# Altium footprint library Miscellaneous Header.PcbLib: 168 footprints (part 7 of 11)
Each footprint in its own frame and in the unit in brackets; x right, y up, seen from the top. Pads: shape width x height; smd on the part's side, far side on the other; paste and mask are expansions set on the pad; w line width, h text height; cw(c..) or ccw(c..) is an arc to the next point about the centre after c.
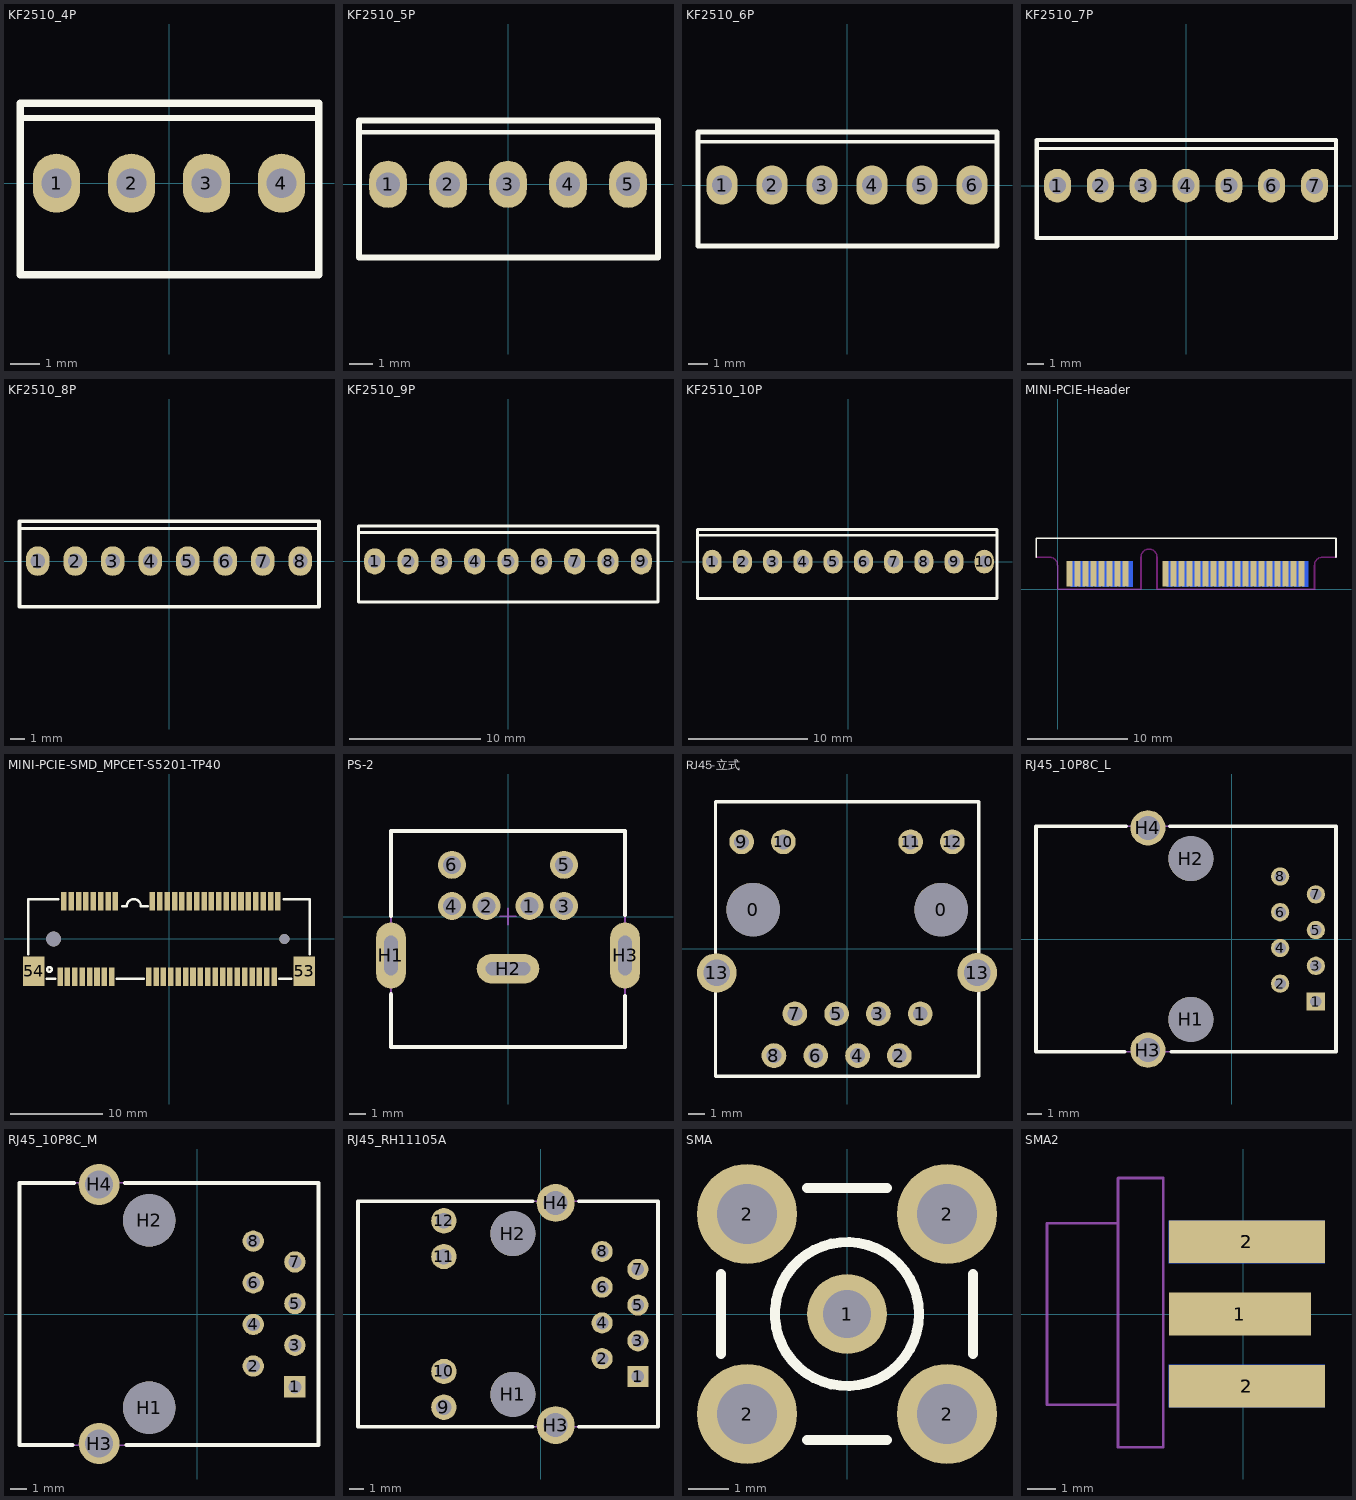
[diagram p6: the footprints below, top view; thin cyan lines are the x and y axes]

## KF2510_4P [mm]
pads (4):
  oval 1.6x2 hole 1: 1(-3.81,0) 2(-1.27,0) 3(1.27,0) 4(3.81,0)
Top Overlay:
  lines w0.2: -5.04,2.2 5.08,2.2
  lines w0.254: -5.04,-3.1 -5.04,2.7 5.08,2.7 5.08,-3.1 -5.04,-3.1
Mechanical 15:
  lines w0.1: -5.08,-3.1 -5.08,2.7 5.08,2.7 5.08,-3.1 -5.08,-3.1
3D body: height 11.73, standoff -2.55, extent -5.09,-3.2 5.07,2.7

## KF2510_5P [mm]
pads (5):
  oval 1.6x2 hole 1: 1(-5.08,0) 2(-2.54,0) 3(0,0) 4(2.54,0) 5(5.08,0)
Top Overlay:
  lines w0.2: -6.31,2.2 6.35,2.2
  lines w0.254: -6.31,-3.1 -6.31,2.7 6.35,2.7 6.35,-3.1 -6.31,-3.1
Mechanical 15:
  lines w0.1: -6.35,-3.1 -6.35,2.7 6.35,2.7 6.35,-3.1 -6.35,-3.1
3D body: height 11.73, standoff -3, extent -1.325,-3.175 6.475,2.725
3D body: height 11.73, standoff -2.55, extent -6.4,-3.175 -1.2,2.725

## KF2510_6P [mm]
pads (6):
  oval 1.6x2 hole 1: 1(-6.35,0) 2(-3.81,0) 3(-1.27,0) 4(1.27,0) 5(3.81,0) 6(6.35,0)
Top Overlay:
  lines w0.2: -7.58,2.2 7.62,2.2
  lines w0.254: -7.58,-3.1 -7.58,2.7 7.62,2.7 7.62,-3.1 -7.58,-3.1
Mechanical 15:
  lines w0.1: -7.62,-3.1 -7.62,2.7 7.62,2.7 7.62,-3.1 -7.62,-3.1
3D body: height 11.73, standoff -3, extent -7.68,-3.15 0.12,2.75
3D body: height 11.73, standoff -3, extent -0.075,-3.15 7.725,2.75

## KF2510_7P [mm]
pads (7):
  oval 1.6x2 hole 1: 1(-7.62,0) 2(-5.08,0) 3(-2.54,0) 4(0,0) 5(2.54,0) 6(5.08,0) 7(7.62,0)
Top Overlay:
  lines w0.2: -8.85,2.2 8.89,2.2
  lines w0.254: -8.85,-3.1 8.89,-3.1 8.89,2.7 -8.85,2.7 -8.85,-3.1
Mechanical 15:
  lines w0.1: -8.89,-3.1 8.89,-3.1 8.89,2.7 -8.89,2.7 -8.89,-3.1
3D body: height 11.73, standoff -2.55, extent -8.91,-3.175 1.25,2.725
3D body: height 11.73, standoff -3, extent 1.175,-3.175 8.975,2.725

## KF2510_8P [mm]
pads (8):
  oval 1.6x2 hole 1: 1(-8.89,0) 2(-6.35,0) 3(-3.81,0) 4(-1.27,0) 5(1.27,0) 6(3.81,0) 7(6.35,0) 8(8.89,0)
Top Overlay:
  lines w0.2: -10.12,2.2 10.06,2.2
  lines w0.254: -10.12,-3.1 -10.12,2.7 10.16,2.7 10.16,-3.1 -10.12,-3.1
Mechanical 15:
  lines w0.1: -10.16,-3.1 -10.16,2.7 10.16,2.7 10.16,-3.1 -10.16,-3.1
3D body: height 11.73, standoff -2.55, extent -10.16,-3.2 0,2.7
3D body: height 11.73, standoff -2.55, extent -0.025,-3.2 10.135,2.7

## KF2510_9P [mm]
pads (9):
  oval 1.6x2 hole 1: 1(-10.16,0) 2(-7.62,0) 3(-5.08,0) 4(-2.54,0) 5(0,0) 6(2.54,0) 7(5.08,0) 8(7.62,0) 9(10.16,0)
Top Overlay:
  lines w0.2: -11.39,2.2 11.43,2.2
  lines w0.254: -11.39,-3.1 -11.39,2.7 11.43,2.7 11.43,-3.1 -11.39,-3.1
Mechanical 15:
  lines w0.1: -11.43,-3.1 -11.43,2.7 11.43,2.7 11.43,-3.1 -11.43,-3.1
3D body: height 11.73, standoff -3, extent 3.725,-3.2 11.525,2.7
3D body: height 11.73, standoff -2.55, extent -1.305,-3.2 3.895,2.7
3D body: height 11.73, standoff -2.55, extent -11.43,-3.2 -1.27,2.7

## KF2510_10P [mm]
pads (10):
  oval 1.6x2 hole 1: 1(-11.43,0) 2(-8.89,0) 3(-6.35,0) 4(-3.81,0) 5(-1.27,0) 6(1.27,0) 7(3.81,0) 8(6.35,0) 9(8.89,0) 10(11.43,0)
Top Overlay:
  lines w0.2: -12.66,2.2 12.4,2.2
  lines w0.254: -12.66,-3.1 -12.66,2.7 12.5,2.7 12.5,-3.1 -12.66,-3.1
Mechanical 15:
  lines w0.1: -12.7,-3.1 -12.7,2.7 12.5,2.7 12.5,-3.1 -12.7,-3.1
3D body: height 11.73, standoff -2.55, extent -12.71,-3.175 12.69,2.725

## MINI-PCIE-Header [mm]
pads (52):
  rect 0.6x2.55 smd: 1(1.194,1.524) 3(1.994,1.524) 5(2.794,1.524) 7(3.594,1.524) 9(4.394,1.524) 11(5.194,1.524) 13(5.994,1.524) 15(6.794,1.524) 17(10.794,1.524) 19(11.594,1.524) 21(12.394,1.524) 23(13.194,1.524) 25(13.994,1.524) 27(14.794,1.524) 29(15.594,1.524) 31(16.394,1.524) 33(17.194,1.524) 35(17.994,1.524) 37(18.794,1.524) 39(19.594,1.524) 41(20.394,1.524) 43(21.194,1.524) 45(21.994,1.524) 47(22.794,1.524) 49(23.594,1.524) 51(24.394,1.524)
  rect 0.6x2.55 smd far side: 2(1.595,1.524) 4(2.395,1.524) 6(3.195,1.524) 8(3.995,1.524) 10(4.795,1.524) 12(5.595,1.524) 14(6.395,1.524) 16(7.195,1.524) 18(11.195,1.524) 20(11.995,1.524) 22(12.795,1.524) 24(13.595,1.524) 26(14.395,1.524) 28(15.195,1.524) 30(15.995,1.524) 32(16.795,1.524) 34(17.595,1.524) 36(18.395,1.524) 38(19.195,1.524) 40(19.995,1.524) 42(20.795,1.524) 44(21.595,1.524) 46(22.395,1.524) 48(23.195,1.524) 50(23.995,1.524) 52(24.795,1.524)
Top Overlay:
  lines w0.152: -2.156,3.199 -2.156,5.1 27.85,5.1 27.85,3.199
Top Paste:
  rectangle: -2.159,-0.076 27.838,3.15
Bottom Paste:
  rectangle: -2.159,-0.076 27.838,3.15
Keep-Out Layer:
  lines w0.152: -2.156,3.199 -0.813,3.199 ; -0.813,3.2 cw(c-0.813,2.4) -0.013,2.4 ; -0.006,2.4 -0.006,-0.001 8.344,-0.001 ; 8.344,0.037 8.344,3.199 cw(c9.144,3.199) 9.944,3.199 9.944,0.012 ; 9.944,-0.001 25.694,-0.001 ; 25.699,-0.001 25.699,2.4 ; 25.705,2.4 cw(c26.505,2.4) 26.505,3.2 ; 26.52,3.199 27.85,3.199

## MINI-PCIE-SMD_MPCET-S5201-TP40 [mm]
pads (56):
  rect 0.6x2 smd: 1(-11.8,-4.1) 2(-11.4,4.1) 3(-11,-4.1) 4(-10.6,4.1) 5(-10.2,-4.1) 6(-9.8,4.1) 7(-9.4,-4.1) 8(-9,4.1) 9(-8.6,-4.1) 10(-8.2,4.1) 11(-7.8,-4.1) 12(-7.4,4.1) 13(-7,-4.1) 14(-6.6,4.1) 15(-6.2,-4.1) 16(-5.8,4.1) 17(-2.2,-4.1) 18(-1.8,4.1) 19(-1.4,-4.1) 20(-1,4.1) 21(-0.6,-4.1) 22(-0.2,4.1) 23(0.2,-4.1) 24(0.6,4.1) 25(1,-4.1) 26(1.4,4.1) 27(1.8,-4.1) 28(2.2,4.1) 29(2.6,-4.1) 30(3,4.1) 31(3.4,-4.1) 32(3.8,4.1) 33(4.2,-4.1) 34(4.6,4.1) 35(5,-4.1) 36(5.4,4.1) 37(5.8,-4.1) 38(6.2,4.1) 39(6.6,-4.1) 40(7,4.1) 41(7.4,-4.1) 42(7.8,4.1) 43(8.2,-4.1) 44(8.6,4.1) 45(9,-4.1) 46(9.4,4.1) 47(9.8,-4.1) 48(10.2,4.1) 49(10.6,-4.1) 50(11,4.1) 51(11.4,-4.1) 52(11.8,4.1)
  rect 2.3x3.2 smd: 53(14.65,-3.5) 54(-14.65,-3.5)
  round 1.6 hole 1.6 unplated: ""(-12.5,0)
  round 1.1 hole 1.1 unplated: ""(12.5,0)
Top Overlay:
  circle w0.254: c-12.954,-3.302 r0.254
  lines w0.254: -15.241,-1.669 -15.241,4.318 ; -15.241,0 -15.241,4.318 ; -13.269,-4.318 -12.331,-4.318 ; -11.967,4.318 -15.241,4.318 ; -5.669,-4.318 -2.731,-4.318 ; -5.08,3.556 -4.572,3.556 cw(c-3.81,3.556) -3.048,3.556 -2.286,3.556 ; 11.931,-4.318 13.269,-4.318 ; 12.446,4.318 15.24,4.318 15.239,-1.669

## PS-2 [mm]
pads (9):
  round 1.7 hole 1.1: 1(1.3,0.65) 2(-1.3,0.65) 3(3.4,0.65) 4(-3.4,0.65) 5(3.4,3.15) 6(-3.4,3.15)
  oval 1.8x4 hole 0.8 slot 2.4 at 90 deg: H1(-7.1,-2.35) H3(7.1,-2.35)
  oval 3.8x1.8 hole 0.8 slot 2.7 at 0 deg: H2(0,-3.15)
Top Overlay:
  lines w0.254: -7.1,-4.7 -7.1,-7.9 7.1,-7.9 7.1,-4.8 ; -7.1,0.048 -7.1,5.2 7.1,5.2 7.1,0.1
Mechanical 15:
  lines w0.1: -0.5,0.025 0.5,0.025 ; 0,-0.475 0,0.525 ; -7.1,-7.9 -7.1,5.2 7.1,5.2 7.1,-7.9 -7.1,-7.9
3D body: height 12.5, standoff -3.8, extent -7.17,-7.874 7.17,5.226

## RJ45-立式 [mm]
pads (16):
  round 3.25 hole 3.25: 0(-5.709,2.381) 0(5.721,2.381)
  round 1.5 hole 0.9: 1(4.451,-3.956) 2(3.181,-6.496) 3(1.911,-3.956) 4(0.641,-6.496) 5(-0.629,-3.956) 6(-1.899,-6.496) 7(-3.169,-3.956) 8(-4.439,-6.496) 9(-6.407,6.496) 10(-3.867,6.496) 11(3.867,6.496) 12(6.407,6.496)
  round 2.4 hole 1.6: 13(-7.918,-1.467) 13(7.918,-1.454)
Top Overlay:
  lines w0.203: -7.997,-7.759 -7.997,8.941 8.003,8.941 8.003,-7.759 -7.997,-7.759
3D body: height 15.92, standoff -3.92, extent -8.17,-10.095 8.17,11.095

## RJ45_10P8C_L [mm]
pads (12):
  rect 1.3x1.3 hole 0.8: 1(5.97,-4.445)
  round 1.3 hole 0.8: 2(3.43,-3.175) 3(5.97,-1.905) 4(3.43,-0.635) 5(5.97,0.635) 6(3.43,1.905) 7(5.97,3.175) 8(3.43,4.445)
  round 3.2 hole 3.2: H1(-2.92,-5.715) H2(-2.92,5.715)
  round 2.5 hole 1.7: H3(-5.97,-7.9) H4(-5.97,7.9)
Top Overlay:
  lines w0.254: -7.6,-8 -13.92,-8 -13.92,8 -7.5,8 ; -4.4,8 7.4,8 7.4,-8 -4.3,-8
Mechanical 15:
  lines w0.1: -13.92,-8 -13.92,8 7.38,8 7.38,-8 -13.92,-8
3D body: height 13.5, standoff -3, extent -13.82,-7.94 7.58,7.94

## RJ45_10P8C_M [mm]
pads (12):
  rect 1.3x1.3 hole 0.8: 1(5.97,-4.445)
  round 1.3 hole 0.8: 2(3.43,-3.175) 3(5.97,-1.905) 4(3.43,-0.635) 5(5.97,0.635) 6(3.43,1.905) 7(5.97,3.175) 8(3.43,4.445)
  round 3.2 hole 3.2: H1(-2.92,-5.715) H2(-2.92,5.715)
  round 2.5 hole 1.7: H3(-5.97,-7.9) H4(-5.97,7.9)
Top Overlay:
  lines w0.254: -7.6,-8 -10.82,-8 -10.82,8 -7.5,8 ; -4.4,8 7.4,8 7.4,-8 -4.3,-8
Mechanical 15:
  lines w0.1: -10.82,-8 7.38,-8 7.38,8 -10.82,8 -10.82,-8
3D body: height 13.98, standoff -3.68, extent -11.035,-7.7 7.635,7.7

## RJ45_RH11105A [mm]
pads (16):
  rect 1.5x1.5 hole 0.9: 1(6.895,-4.445)
  round 1.5 hole 0.9: 2(4.355,-3.175) 3(6.895,-1.905) 4(4.355,-0.635) 5(6.895,0.635) 6(4.355,1.905) 7(6.895,3.175) 8(4.355,4.445)
  round 1.8 hole 1.1: 9(-6.895,-6.625) 10(-6.895,-4.085) 11(-6.895,4.085) 12(-6.895,6.625)
  round 3.2 hole 3.2: H1(-1.995,-5.715) H2(-1.995,5.715)
  round 2.7 hole 1.7: H3(1.055,-7.9) H4(1.055,7.9)
Top Overlay:
  lines w0.254: -0.595,-8 -12.995,-8 -12.995,8 -0.595,8 ; 2.705,-8 8.325,-8 8.325,8 2.705,8
Mechanical 15:
  lines w0.1: -12.995,-8 8.305,-8 8.305,8 -12.995,8 -12.995,-8
3D body: height 13.5, standoff -3, extent -12.895,-7.94 8.505,7.94

## SMA [mm]
pads (5):
  round 2 hole 1.2: 1(0,0)
  round 2.5 hole 1.5: 2(-2.5,-2.5) 2(-2.5,2.5) 2(2.5,-2.5) 2(2.5,2.5)
Top Overlay:
  circle w0.254: c0,0 r1.8
  lines w0.254: -3.15,-1 -3.15,1 ; -1,-3.15 1,-3.15 ; -1,3.15 1,3.15 ; 3.15,-1 3.15,1
Mechanical 1:
  circle w0.025: c0,0 r1.8
3D body: height 9.65, standoff -3.8, extent -3.155,-3.15 3.155,3.16

## SMA2 [mm]
pads (5):
  rect 5x1.5 smd: 1(-0.125,0)
  rect 5.5x1.5 smd: 2(0.125,-2.54) 2(0.125,2.54)
  rect 5.5x1.5 smd far side: 2(0.125,-2.54) 2(0.125,2.54)
Mechanical 15:
  lines w0.1: -4.425,-3.2 -6.925,-3.2 -6.925,3.2 -4.425,3.2 ; -4.425,-4.7 -4.425,4.8 -2.825,4.8 -2.825,-4.7 -4.425,-4.7
3D body: height 4.4, standoff -3.52, extent -12.16,-4.7 2.11,4.82